# Altium footprint library PcbLib1.PcbLib: 148 footprints (part 6 of 10)
Each footprint in its own frame and in the unit in brackets; x right, y up, seen from the top. Pads: shape width x height; smd on the part's side, far side on the other; paste and mask are expansions set on the pad; w line width, h text height; cw(c..) or ccw(c..) is an arc to the next point about the centre after c.
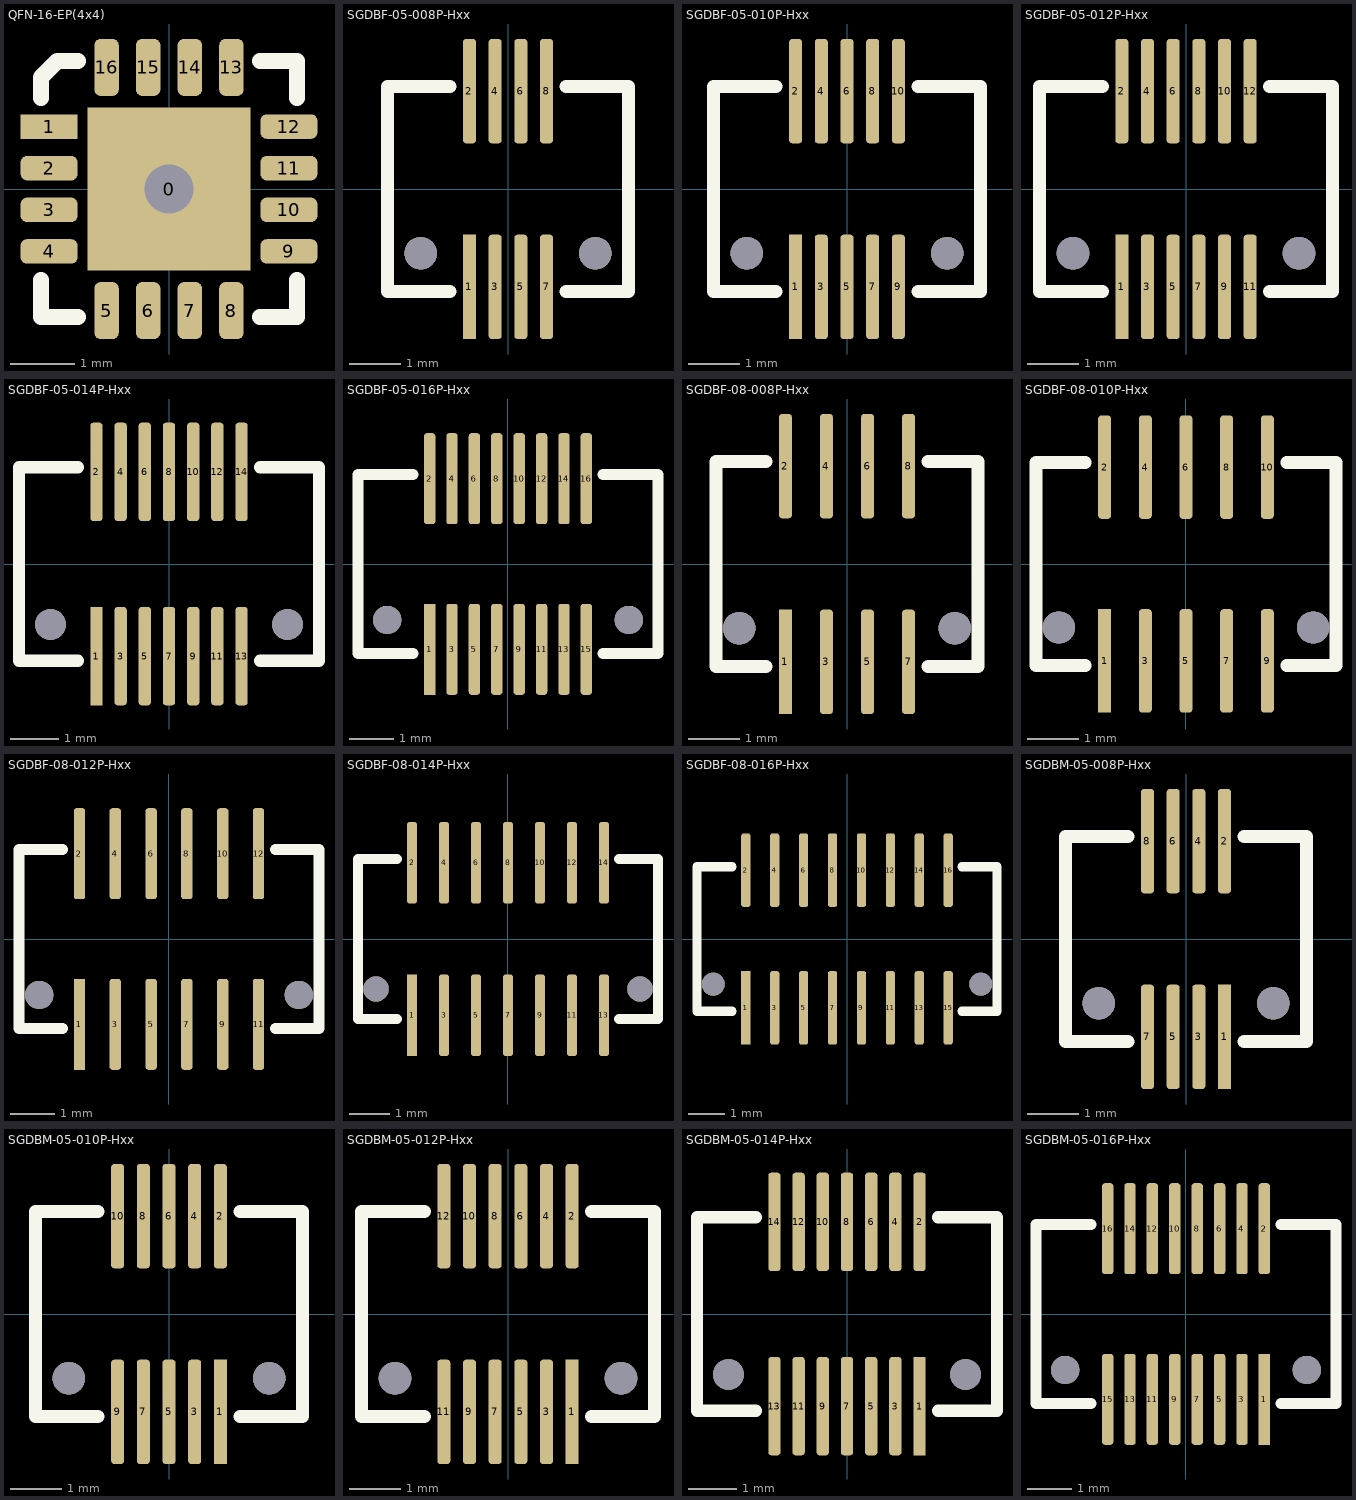
[diagram p5: the footprints below, top view; thin cyan lines are the x and y axes]

## QFN-16-EP(4x4) [mil]
pads (17):
  rect 100x100 smd mask+4: 0(0,0)
  rect 35x15 smd mask+4: 1(-73.74,38.39)
  rrect50% 35x15 smd mask+4: 2(-73.74,12.8) 3(-73.74,-12.8) 4(-73.74,-38.39) 9(73.74,-38.39) 10(73.74,-12.8) 11(73.74,12.8) 12(73.74,38.39)
  rrect50% 15x35 smd mask+4: 5(-38.39,-74.74) 6(-12.8,-74.74) 7(12.8,-74.74) 8(38.39,-74.74) 13(38.39,74.74) 14(12.8,74.74) 15(-12.8,74.74) 16(-38.39,74.74)
via 0,0 diameter 40 hole 30
Top Overlay:
  lines w10: -78.74,-55.89 -78.74,-78.74 -55.89,-78.74 ; -78.74,55.89 -78.74,68.74 -68.74,78.74 -55.89,78.74 ; 55.89,-78.74 78.74,-78.74 78.74,-55.89 ; 55.89,78.74 78.74,78.74 78.74,55.89
3D body "QFN-16-EP(4x4).step": height 31.5, standoff 0, extent -80.71,-80.71 80.71,80.71

## SGDBF-05-008P-Hxx [mil] "山谷道电子 0.5mm 8pin Famale"
pads (10):
  rect 10x80 smd: 1(-29.53,-75)
  rrect50% 10x80 smd: 2(-29.53,75) 3(-9.84,-75) 4(-9.84,75) 5(9.84,-75) 6(9.84,75) 7(29.53,-75) 8(29.53,75)
  round 25 hole 25 unplated: ""(-66.93,-49.21) ""(66.93,-49.21)
Top Overlay:
  lines w10: -44.53,-78.74 -92.52,-78.74 -92.52,78.74 -44.53,78.74 ; 44.53,-78.74 92.52,-78.74 92.52,78.74 44.53,78.74

## SGDBF-05-010P-Hxx [mil] "山谷道电子 0.5mm 10pin Famale"
pads (12):
  rect 10x80 smd: 1(-39.37,-75)
  rrect50% 10x80 smd: 2(-39.37,75) 3(-19.68,-75) 4(-19.68,75) 5(0,-75) 6(0,75) 7(19.69,-75) 8(19.69,75) 9(39.37,-75) 10(39.37,75)
  round 25 hole 25 unplated: ""(-76.77,-49.21) ""(76.77,-49.21)
Top Overlay:
  lines w10: -54.37,-78.74 -102.36,-78.74 -102.36,78.74 -54.37,78.74 ; 54.37,-78.74 102.36,-78.74 102.36,78.74 54.37,78.74

## SGDBF-05-012P-Hxx [mil] "山谷道电子 0.5mm 12pin Famale"
pads (14):
  rect 10x80 smd: 1(-49.21,-75)
  rrect50% 10x80 smd: 2(-49.21,75) 3(-29.53,-75) 4(-29.53,75) 5(-9.84,-75) 6(-9.84,75) 7(9.84,-75) 8(9.84,75) 9(29.53,-75) 10(29.53,75) 11(49.21,-75) 12(49.21,75)
  round 25 hole 25 unplated: ""(-86.61,-49.21) ""(86.61,-49.21)
Top Overlay:
  lines w10: -64.21,-78.74 -112.2,-78.74 -112.2,78.74 -64.21,78.74 ; 64.21,-78.74 112.2,-78.74 112.2,78.74 64.21,78.74

## SGDBF-05-014P-Hxx [mil] "山谷道电子 0.5mm 14pin Famale"
pads (16):
  rect 10x80 smd: 1(-59.06,-75)
  rrect50% 10x80 smd: 2(-59.06,75) 3(-39.37,-75) 4(-39.37,75) 5(-19.69,-75) 6(-19.69,75) 7(0,-75) 8(0,75) 9(19.68,-75) 10(19.68,75) 11(39.37,-75) 12(39.37,75) 13(59.06,-75) 14(59.06,75)
  round 25 hole 25 unplated: ""(-96.46,-49.21) ""(96.46,-49.21)
Top Overlay:
  lines w10: -74.06,-78.74 -122.05,-78.74 -122.05,78.74 -74.06,78.74 ; 74.06,-78.74 122.05,-78.74 122.05,78.74 74.06,78.74

## SGDBF-05-016P-Hxx [mil] "山谷道电子 0.5mm 16pin Famale"
pads (18):
  rect 10x80 smd: 1(-68.9,-75)
  rrect50% 10x80 smd: 2(-68.9,75) 3(-49.21,-75) 4(-49.21,75) 5(-29.53,-75) 6(-29.53,75) 7(-9.84,-75) 8(-9.84,75) 9(9.84,-75) 10(9.84,75) 11(29.53,-75) 12(29.53,75) 13(49.21,-75) 14(49.21,75) 15(68.9,-75) 16(68.9,75)
  round 25 hole 25 unplated: ""(-106.3,-49.21) ""(106.3,-49.21)
Top Overlay:
  lines w10: -83.9,-78.74 -131.89,-78.74 -131.89,78.74 -83.9,78.74 ; 83.9,-78.74 131.89,-78.74 131.89,78.74 83.9,78.74
3D body "SGDBF-05-016P-H40.stp": height 157.8, standoff -21.33, extent -132.1,-102.34 131.68,102.39

## SGDBF-08-008P-Hxx [mil] "山谷道电子 0.8mm 8pin Famale"
pads (10):
  rect 10x80 smd: 1(-47.24,-75)
  rrect50% 10x80 smd: 2(-47.24,75) 3(-15.75,-75) 4(-15.75,75) 5(15.75,-75) 6(15.75,75) 7(47.24,-75) 8(47.24,75)
  round 25 hole 25 unplated: ""(-82.68,-49.21) ""(82.68,-49.21)
Top Overlay:
  lines w10: -62.24,-78.74 -100.39,-78.74 -100.39,78.74 -62.24,78.74 ; 62.24,-78.74 100.39,-78.74 100.39,78.74 62.24,78.74

## SGDBF-08-010P-Hxx [mil] "山谷道电子 0.8mm 10pin Famale"
pads (12):
  rect 10x80 smd: 1(-62.99,-75)
  rrect50% 10x80 smd: 2(-62.99,75) 3(-31.5,-75) 4(-31.5,75) 5(0,-75) 6(0,75) 7(31.5,-75) 8(31.5,75) 9(62.99,-75) 10(62.99,75)
  round 25 hole 25 unplated: ""(-98.43,-49.21) ""(98.43,-49.21)
Top Overlay:
  lines w10: -77.99,-78.74 -116.14,-78.74 -116.14,78.74 -77.99,78.74 ; 77.99,-78.74 116.14,-78.74 116.14,78.74 77.99,78.74

## SGDBF-08-012P-Hxx [mil] "山谷道电子 0.8mm 12pin Famale"
pads (14):
  rect 10x80 smd: 1(-78.74,-75)
  rrect50% 10x80 smd: 2(-78.74,75) 3(-47.24,-75) 4(-47.24,75) 5(-15.75,-75) 6(-15.75,75) 7(15.75,-75) 8(15.75,75) 9(47.24,-75) 10(47.24,75) 11(78.74,-75) 12(78.74,75)
  round 25 hole 25 unplated: ""(-114.17,-49.21) ""(114.17,-49.21)
Top Overlay:
  lines w10: -93.74,-78.74 -131.89,-78.74 -131.89,78.74 -93.74,78.74 ; 93.74,-78.74 131.89,-78.74 131.89,78.74 93.74,78.74

## SGDBF-08-014P-Hxx [mil] "山谷道电子 0.8mm 14pin Famale"
pads (16):
  rect 10x80 smd: 1(-94.49,-75)
  rrect50% 10x80 smd: 2(-94.49,75) 3(-62.99,-75) 4(-62.99,75) 5(-31.5,-75) 6(-31.5,75) 7(0,-75) 8(0,75) 9(31.5,-75) 10(31.5,75) 11(62.99,-75) 12(62.99,75) 13(94.49,-75) 14(94.49,75)
  round 25 hole 25 unplated: ""(-129.92,-49.21) ""(129.92,-49.21)
Top Overlay:
  lines w10: -109.49,-78.74 -147.64,-78.74 -147.64,78.74 -109.49,78.74 ; 109.49,-78.74 147.64,-78.74 147.64,78.74 109.49,78.74

## SGDBF-08-016P-Hxx [mil] "山谷道电子 0.8mm 16pin Famale"
pads (18):
  rect 10x80 smd: 1(-110.24,-75)
  rrect50% 10x80 smd: 2(-110.24,75) 3(-78.74,-75) 4(-78.74,75) 5(-47.24,-75) 6(-47.24,75) 7(-15.75,-75) 8(-15.75,75) 9(15.75,-75) 10(15.75,75) 11(47.24,-75) 12(47.24,75) 13(78.74,-75) 14(78.74,75) 15(110.24,-75) 16(110.24,75)
  round 25 hole 25 unplated: ""(-145.67,-49.21) ""(145.67,-49.21)
Top Overlay:
  lines w10: -125.24,-78.74 -163.39,-78.74 -163.39,78.74 -125.24,78.74 ; 125.24,-78.74 163.39,-78.74 163.39,78.74 125.24,78.74

## SGDBM-05-008P-Hxx [mil] "山谷道电子 0.5mm 8pin Male"
pads (10):
  rect 10x80 smd: 1(29.53,-75)
  rrect50% 10x80 smd: 2(29.53,75) 3(9.84,-75) 4(9.84,75) 5(-9.84,-75) 6(-9.84,75) 7(-29.53,-75) 8(-29.53,75)
  round 25 hole 25 unplated: ""(-66.93,-49.21) ""(66.93,-49.21)
Top Overlay:
  lines w10: -44.53,-78.74 -92.52,-78.74 -92.52,78.74 -44.53,78.74 ; 44.53,-78.74 92.52,-78.74 92.52,78.74 44.53,78.74

## SGDBM-05-010P-Hxx [mil] "山谷道电子 0.5mm 10pin Male"
pads (12):
  rect 10x80 smd: 1(39.37,-75)
  rrect50% 10x80 smd: 2(39.37,75) 3(19.68,-75) 4(19.68,75) 5(0,-75) 6(0,75) 7(-19.69,-75) 8(-19.69,75) 9(-39.37,-75) 10(-39.37,75)
  round 25 hole 25 unplated: ""(-76.77,-49.21) ""(76.77,-49.21)
Top Overlay:
  lines w10: -54.37,-78.74 -102.36,-78.74 -102.36,78.74 -54.37,78.74 ; 54.37,-78.74 102.36,-78.74 102.36,78.74 54.37,78.74

## SGDBM-05-012P-Hxx [mil] "山谷道电子 0.5mm 12pin Male"
pads (14):
  rect 10x80 smd: 1(49.21,-75)
  rrect50% 10x80 smd: 2(49.21,75) 3(29.53,-75) 4(29.53,75) 5(9.84,-75) 6(9.84,75) 7(-9.84,-75) 8(-9.84,75) 9(-29.53,-75) 10(-29.53,75) 11(-49.21,-75) 12(-49.21,75)
  round 25 hole 25 unplated: ""(-86.61,-49.21) ""(86.61,-49.21)
Top Overlay:
  lines w10: -64.21,-78.74 -112.2,-78.74 -112.2,78.74 -64.21,78.74 ; 64.21,-78.74 112.2,-78.74 112.2,78.74 64.21,78.74

## SGDBM-05-014P-Hxx [mil] "山谷道电子 0.5mm 14pin Male"
pads (16):
  rect 10x80 smd: 1(59.06,-75)
  rrect50% 10x80 smd: 2(59.06,75) 3(39.37,-75) 4(39.37,75) 5(19.68,-75) 6(19.68,75) 7(0,-75) 8(0,75) 9(-19.69,-75) 10(-19.69,75) 11(-39.37,-75) 12(-39.37,75) 13(-59.06,-75) 14(-59.06,75)
  round 25 hole 25 unplated: ""(-96.46,-49.21) ""(96.46,-49.21)
Top Overlay:
  lines w10: -74.05,-78.74 -122.05,-78.74 -122.05,78.74 -74.05,78.74 ; 74.05,-78.74 122.05,-78.74 122.05,78.74 74.05,78.74

## SGDBM-05-016P-Hxx [mil] "山谷道电子 0.5mm 16pin Male"
pads (18):
  rect 10x80 smd: 1(68.9,-75)
  rrect50% 10x80 smd: 2(68.9,75) 3(49.21,-75) 4(49.21,75) 5(29.53,-75) 6(29.53,75) 7(9.84,-75) 8(9.84,75) 9(-9.84,-75) 10(-9.84,75) 11(-29.53,-75) 12(-29.53,75) 13(-49.21,-75) 14(-49.21,75) 15(-68.9,-75) 16(-68.9,75)
  round 25 hole 25 unplated: ""(-106.3,-49.21) ""(106.3,-49.21)
Top Overlay:
  lines w10: -83.9,-78.74 -131.89,-78.74 -131.89,78.74 -83.9,78.74 ; 83.9,-78.74 131.89,-78.74 131.89,78.74 83.9,78.74